# Altium footprint library Misc.PcbLib: 159 footprints (part 7 of 10)
Each footprint in its own frame and in the unit in brackets; x right, y up, seen from the top. Pads: shape width x height; smd on the part's side, far side on the other; paste and mask are expansions set on the pad; w line width, h text height; cw(c..) or ccw(c..) is an arc to the next point about the centre after c.
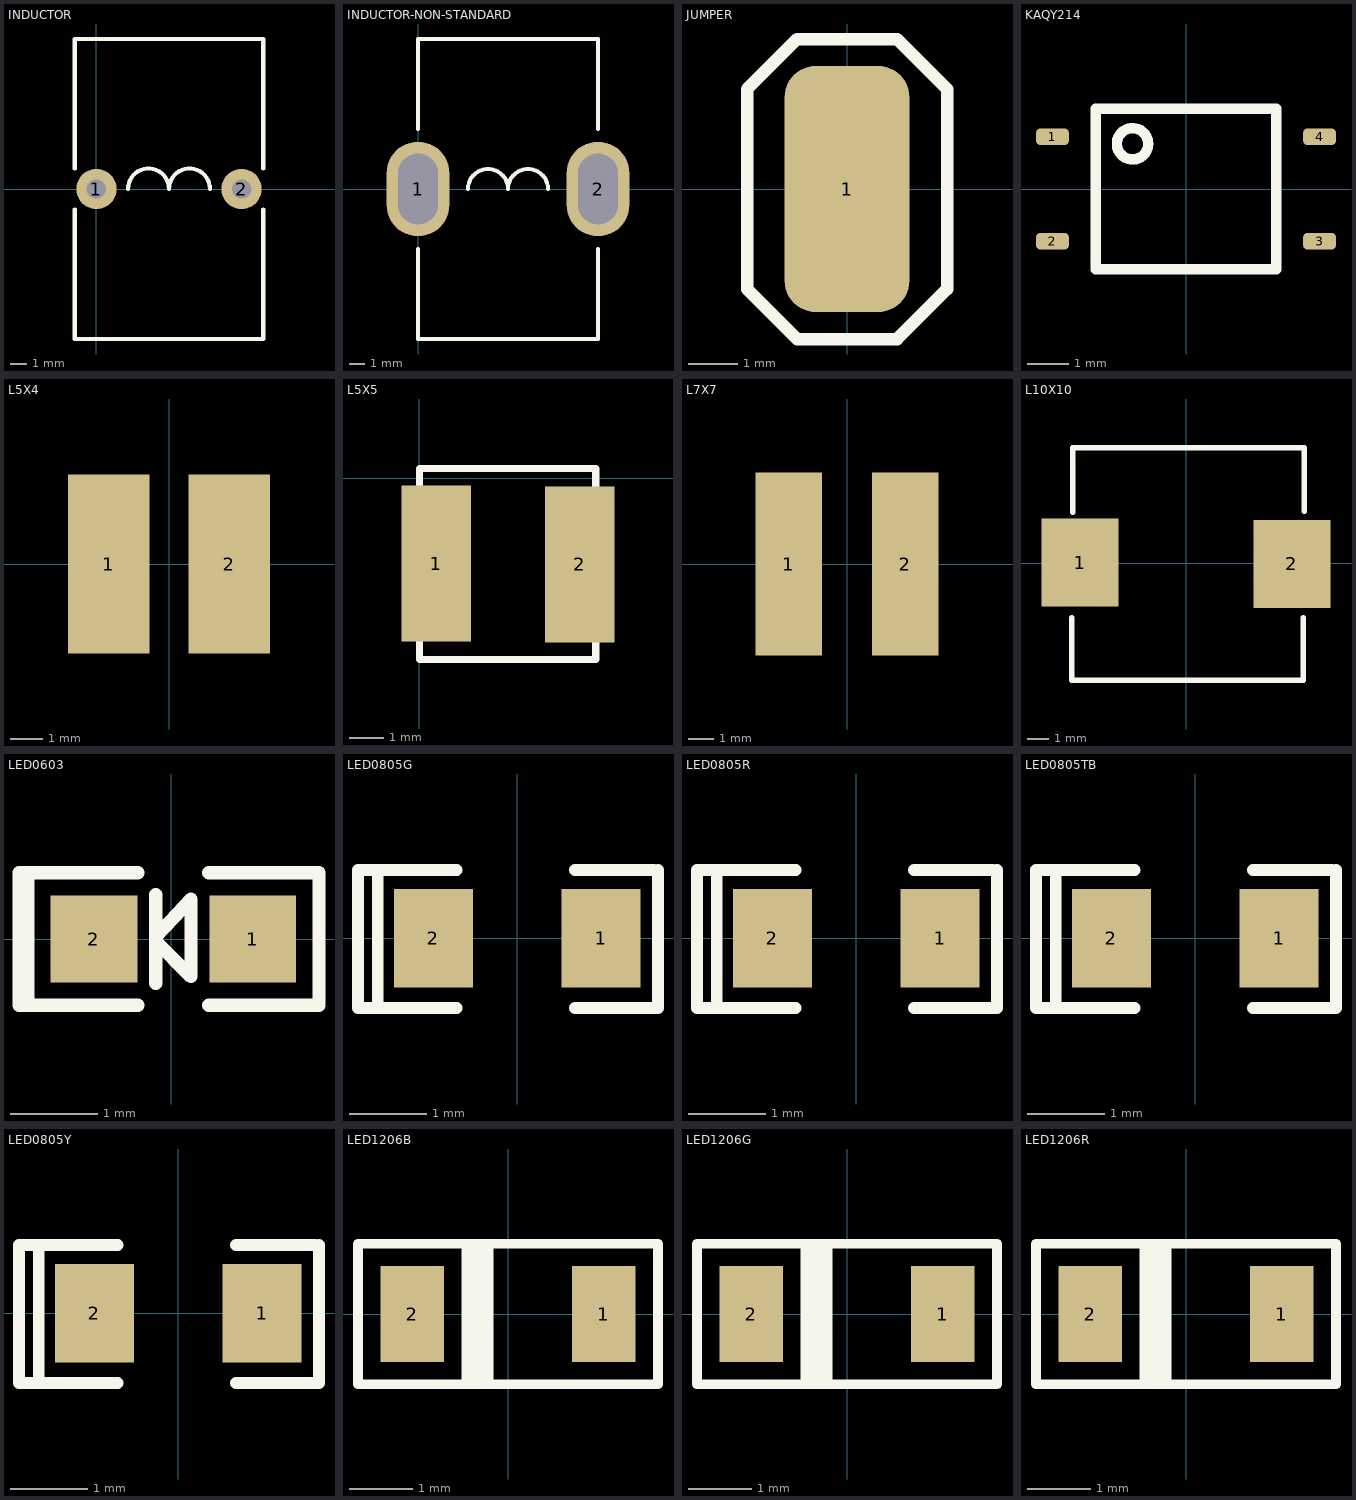
[diagram p6: the footprints below, top view; thin cyan lines are the x and y axes]

## INDUCTOR [mm]
pads (2):
  round 2.5 hole 1.2: 1(0,0) 2(9,0)
Top Overlay:
  lines w0.254: -1.342,-1.27 -1.342,-9.3 10.342,-9.3 10.342,-1.27 ; -1.342,1.27 -1.342,9.3 10.342,9.3 10.342,1.27 ; 1.96,0 cw(c3.23,0) 4.5,0 cw(c5.77,0) 7.04,0
3D body "Triad Magnetics-FIT50-6.STEP": height 17.27, standoff -3.56, extent -1.215,-8.255 10.215,8.255

## INDUCTOR-NON-STANDARD [mm]
pads (2):
  oval 4x6 hole 2.5 slot 4.5 at 90 deg: 1(0,0) 2(11.43,0)
Top Overlay:
  lines w0.254: 0,-3.81 0,-9.525 11.43,-9.525 11.43,-3.81 ; 0,3.81 0,9.525 11.43,9.525 11.43,3.81 ; 3.175,0 cw(c4.445,0) 5.715,0 cw(c6.985,0) 8.255,0

## JUMPER [mm]
pads (1):
  rrect50% 2.54x5 smd: 1(0,0)
Top Overlay:
  lines w0.254: -2.032,-2.032 -1.016,-3.048 1.016,-3.048 2.032,-2.032 2.032,2.032 1.016,3.048 -1.016,3.048 -2.032,2.032 -2.032,-2.032

## KAQY214 [mm]
height 2
pads (4):
  rrect50% 0.8x0.4 smd: 1(-3.25,1.27) 2(-3.25,-1.27) 3(3.25,-1.27) 4(3.25,1.27)
Top Overlay:
  circle w0.254: c-1.3,1.1 r0.381
  lines w0.254: -2.2,-1.95 -2.2,1.95 2.2,1.95 2.2,-1.95 -2.2,-1.95

## L5X4 [mm]
height 4.5
pads (2):
  rect 2.5x5.5 smd: 1(-1.85,0) 2(1.85,0)
3D body "µç¸Ð.STEP": height 4.5, standoff -0.01, extent -2.857,-2.6 2.857,2.6

## L5X5 [mm]
pads (2):
  rect 2x4.5 smd: 1(0.483,-2.464) 2(4.623,-2.489)
Top Overlay:
  lines w0.203: 0,-5.232 5.08,-5.232 5.08,0.279 0,0.279 0,-5.232
3D body "CDRH4D28.step": height 2.91, standoff 0, extent 0.065,-4.914 4.965,-0.014

## L7X7 [mm] "POWER INDUCTOR 5uH"
pads (2):
  rect 2.65x7.3 smd: 1(-2.325,0) 2(2.325,0)
3D body "SUMIDA-CDRH6D28.STEP": height 2.9, standoff 0, extent -3.36,-3.33 3.34,3.37

## L10X10 [mil]
pads (2):
  rect 140x160 smd: 1(-192.08,1.25) 2(192.08,-1.25)
Top Overlay:
  lines w10: -207.08,-98.75 -207.08,-212.08 212.92,-212.08 212.92,-98.75 ; -205.42,92.92 -205.42,209.58 214.58,209.58 214.58,94.58
3D body: height 157.48, standoff 0, extent -207,-213 215,211

## LED0603 [mm]
pads (2):
  rect 1x1 smd: 1(0.94,0) 2(-0.889,0)
Top Overlay:
  lines w0.152: -1.651,-0.762 -1.651,0.762 ; -0.381,-0.762 -1.751,-0.762 -1.751,0.762 -0.381,0.762 ; -0.178,-0.508 -0.178,0.508 ; -0.178,-0.025 0.229,-0.432 0.229,0.457 -0.178,0.025 ; 0.432,-0.762 1.702,-0.762 1.702,0.762 0.432,0.762
3D body: height 0.38, standoff 0, extent -0.988,-0.532 -0.563,0.532
3D body: height 0.38, standoff 0, extent 0.602,-0.535 1.026,0.535
3D body: height 0.38, standoff 0, extent -0.567,-0.533 0.603,0.533
3D body: height 0.46, standoff 0, extent -0.255,-0.279 0.28,0.279

## LED0805G [mil]
pads (2):
  rect 40x50 smd: 1(42.5,0) 2(-42.5,0)
Top Overlay:
  lines w5.98: -80.65,-35.39 -70.65,-35.39 ; -80.65,34.61 -70.65,34.61
  lines w6: -80.65,-35.39 -80.65,34.61 ; -30.65,-35.39 -70.65,-35.39 -70.65,34.61 -30.65,34.61 ; 29.35,-35.39 71.36,-35.39 71.36,34.61 ; 29.35,34.61 69.35,34.61
3D body "User Library-User Library-led_0805 GRE.STEP": height 43.31, standoff 0, extent -39.76,-24.6 39.77,24.61

## LED0805R [mil]
pads (2):
  rect 40x50 smd: 1(42.5,0) 2(-42.5,0)
Top Overlay:
  lines w5.98: -80.65,-35.39 -70.65,-35.39 ; -80.65,34.61 -70.65,34.61
  lines w6: -80.65,-35.39 -80.65,34.61 ; -30.65,-35.39 -70.65,-35.39 -70.65,34.61 -30.65,34.61 ; 29.35,-35.39 71.36,-35.39 71.36,34.61 ; 29.35,34.61 69.35,34.61
3D body "User Library-led_0805.STEP": height 43.31, standoff 0, extent -39.76,-24.6 39.77,24.61

## LED0805TB [mil]
pads (2):
  rect 40x50 smd: 1(42.5,0) 2(-42.5,0)
Top Overlay:
  lines w5.98: -80.65,-35.39 -70.65,-35.39 ; -80.65,34.61 -70.65,34.61
  lines w6: -80.65,-35.39 -80.65,34.61 ; -30.65,-35.39 -70.65,-35.39 -70.65,34.61 -30.65,34.61 ; 29.35,-35.39 71.36,-35.39 71.36,34.61 ; 29.35,34.61 69.35,34.61
3D body "SW3dPS-LED SMD0805.STEP": height 33.45, standoff 0.23, extent -36.63,-17.97 44.57,17.71

## LED0805Y [mil]
pads (2):
  rect 40x50 smd: 1(42.5,0) 2(-42.5,0)
Top Overlay:
  lines w5.98: -80.65,-35.39 -70.65,-35.39 ; -80.65,34.61 -70.65,34.61
  lines w6: -80.65,-35.39 -80.65,34.61 ; -30.65,-35.39 -70.65,-35.39 -70.65,34.61 -30.65,34.61 ; 29.35,-35.39 71.36,-35.39 71.36,34.61 ; 29.35,34.61 69.35,34.61
3D body "User Library-User Library-led_0805 YEL.STEP": height 43.31, standoff 0, extent -39.76,-24.6 39.77,24.61

## LED1206B [mil]
pads (2):
  rect 40x60 smd: 1(60,0) 2(-60,0)
Top Overlay:
  region: -9,44 -29,44 -29,-44 -9,-44
  lines w6: -94,-44 94,-44 94,44 -94,44 -94,-44

## LED1206G [mil]
pads (2):
  rect 40x60 smd: 1(60,0) 2(-60,0)
Top Overlay:
  region: -9,44 -29,44 -29,-44 -9,-44
  lines w6: -94,-44 -94,44 94,44 94,-44 -94,-44
3D body "User Library-User Library-led_0805 GRE.STEP": height 43.31, standoff 0, extent -39.77,-24.61 39.76,24.6

## LED1206R [mil]
pads (2):
  rect 40x60 smd: 1(60,0) 2(-60,0)
Top Overlay:
  region: -9,44 -29,44 -29,-44 -9,-44
  lines w6: -94,-44 -94,44 94,44 94,-44 -94,-44
3D body "User Library-led_0805.STEP": height 43.31, standoff 0, extent -39.76,-24.6 39.77,24.61